# Altium footprint library DevKit - PCB.PcbLib: 30 footprints (part 1 of 2)
Each footprint in its own frame and in the unit in brackets; x right, y up, seen from the top. Pads: shape width x height; smd on the part's side, far side on the other; paste and mask are expansions set on the pad; w line width, h text height; cw(c..) or ccw(c..) is an arc to the next point about the centre after c.
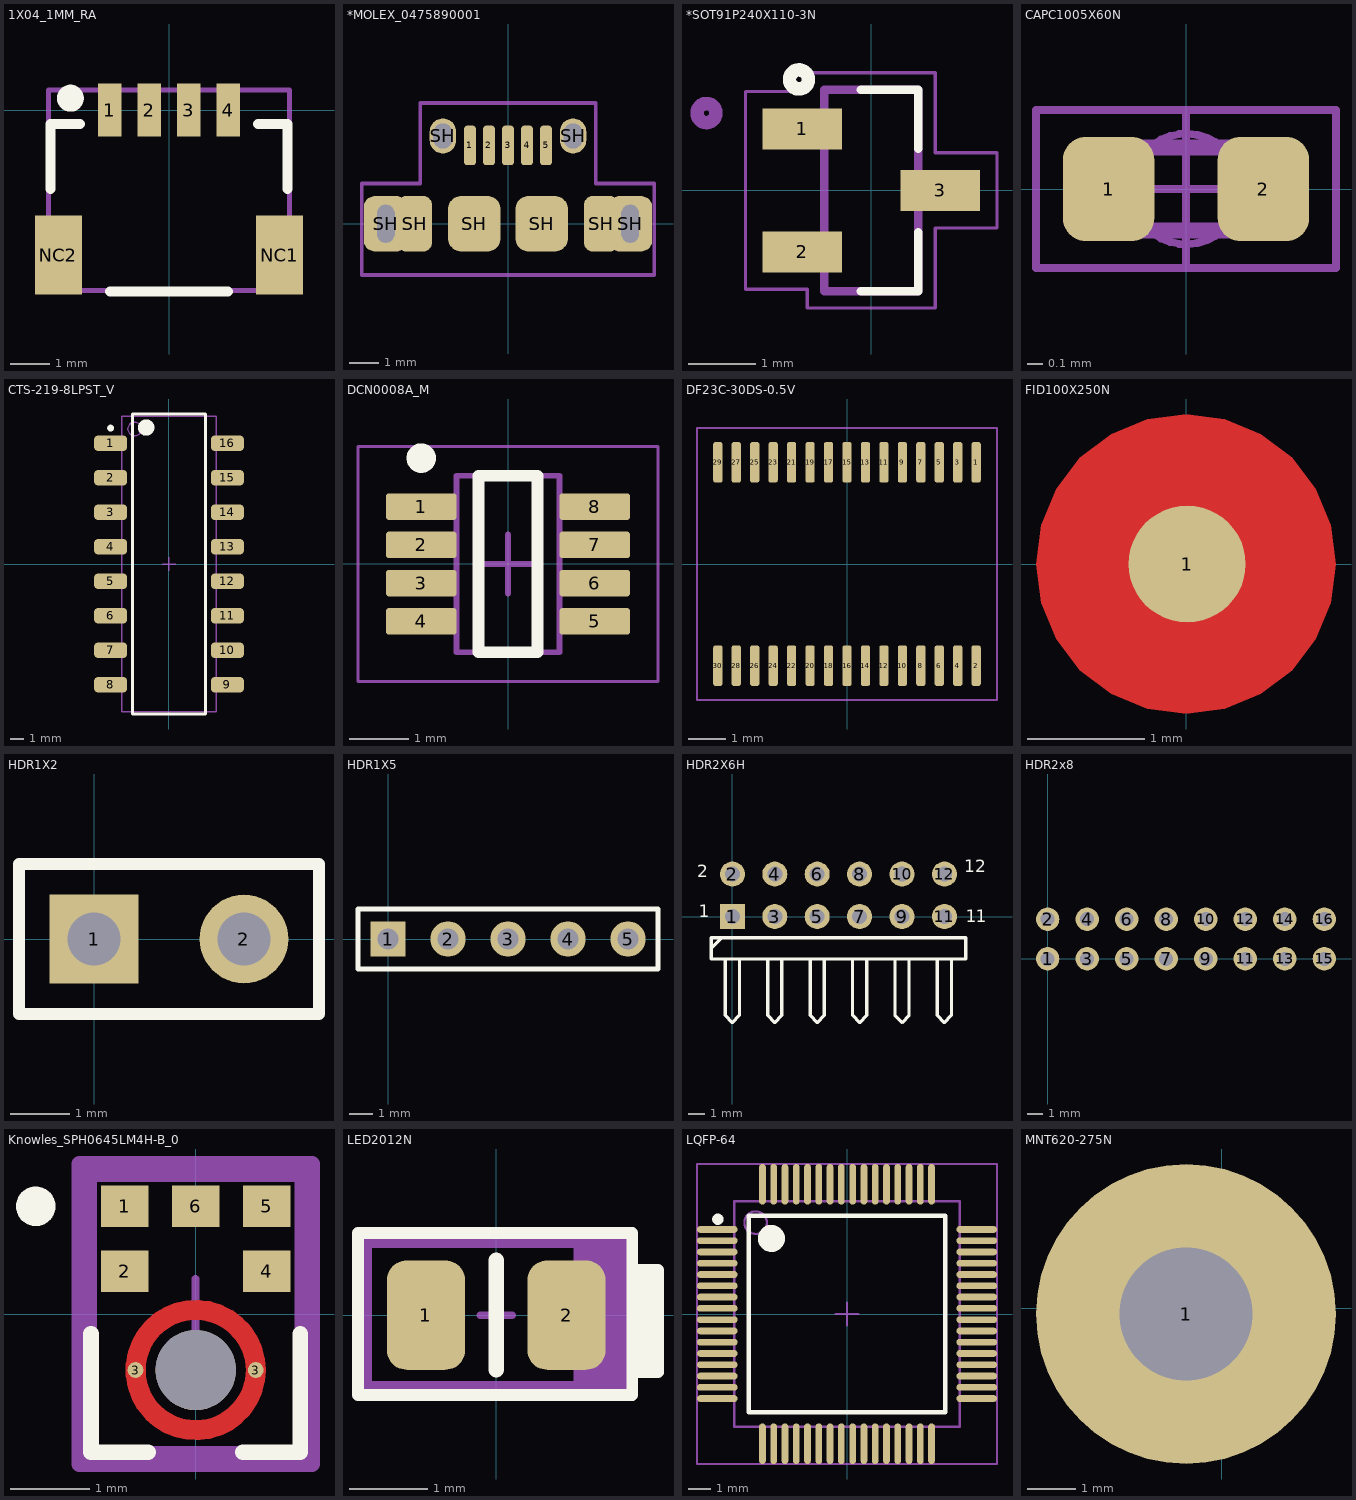
[diagram p0: the footprints below, top view; thin cyan lines are the x and y axes]

## 1X04_1MM_RA [mm]
pads (6):
  rect 0.6x1.35 smd: 1(-1.5,0) 2(-0.5,0) 3(0.5,0) 4(1.5,0)
  rect 1.2x2 smd: NC1(2.8,-3.675) NC2(-2.8,-3.675)
Top Overlay:
  circle w0.4: c-2.5,0.3 r0.141
  lines w0.254: -3,-2 -3,-0.35 -2.25,-0.35 ; -1.5,-4.6 1.5,-4.6 ; 2.25,-0.35 3,-0.35 3,-2
Mechanical 16:
  lines w0.127: -3.048,-4.572 -3.048,0.508 3.048,0.508 3.048,-4.572 -3.048,-4.572
  text ".Designator" at -1.016,-2.235 h1.5
3D body "SM04B-SRSS-TB(LF)(SN)--3DModel-STEP-56544.STEP": height 3.25, standoff 0.3, extent -3,-4.53 3,0.42

## *MOLEX_0475890001 [mm]
pads (13):
  rrect50% 0.4x1.35 smd mask+0.051: 1(-1.3,2.675) 2(-0.65,2.675) 3(0,2.675) 4(0.65,2.675) 5(1.3,2.675)
  rrect50% 1.5x1.9 hole 0.6 slot 1.3 at 90 deg: SH(-4.175,0) SH(4.175,0)
  rrect50% 1.175x1.9 smd: SH(-3.187,0) SH(3.187,0)
  oval 0.9x1.2 hole 0.65 slot 0.85 at 90 deg: SH(-2.225,3) SH(2.225,3)
  rrect50% 1.8x1.9 smd: SH(-1.15,0) SH(1.15,0)
Mechanical 16:
  lines w0.127: -5,-1.75 -5,1.375 -3,1.375 -3,4.125 3,4.125 3,1.375 5,1.375 5,-1.75 -5,-1.75
  text ".Designator" at -1.524,-0.33 h1.5
3D body "475890001.stp": height 2.74, standoff -0.57, extent -4.325,-2.719 4.325,3.175

## *SOT91P240X110-3N [mm]
pads (3):
  rect 1.18x0.61 smd: 1(-1.025,0.915) 2(-1.025,-0.915) 3(1.025,0)
Top Overlay:
  circle w0.2: c-1.075,1.65 r0.141
  lines w0.127: -0.152,-1.5 0.7,-1.5 0.7,-0.62 ; -0.152,1.5 0.7,1.5 0.7,0.62
Mechanical 4:
  circle w0.2: c-2.45,1.15 r0.141
  circle w0.2: c-2.45,1.15 r0.141
  lines w0.127: -0.7,-1.5 -0.7,1.5 ; -0.7,-1.5 -0.7,1.5 ; -0.7,-1.5 0.7,-1.5 ; -0.7,-1.5 0.7,-1.5 ; -0.7,1.5 0.7,1.5 ; -0.7,1.5 0.7,1.5 ; 0.7,-1.5 0.7,1.5 ; 0.7,-1.5 0.7,1.5
Mechanical 16:
  lines w0.05: -1.87,-1.47 -1.87,1.47 -0.95,1.47 -0.95,1.75 0.95,1.75 0.95,0.56 1.87,0.56 1.87,-0.56 0.95,-0.56 0.95,-1.75 -0.95,-1.75 -0.95,-1.47 -1.87,-1.47

## CAPC1005X60N [mm]
pads (2):
  rrect50% 0.58x0.66 smd: 1(-0.49,0) 2(0.49,0)
Mechanical 4:
  circle w0.05: c0,0 r0.35
  lines w0.05: -0.5,0 0.5,0 ; 0,-0.5 0,0.5 ; -0.95,-0.5 -0.95,0.5 0.95,0.5 0.95,-0.5 -0.95,-0.5
Mechanical 13:
  lines w0.001: -0.55,-0.3 -0.55,0.3 0.55,0.3 0.55,-0.3 -0.55,-0.3
Mechanical 16:
  lines w0.1: -0.512,-0.262 -0.512,0.262 0.512,0.262 0.512,-0.262 -0.512,-0.262
  text ".Designator" at 0.635,0.33 h1.5
3D body "CAP 0402 (1005 metric).STEP": height 0.55, standoff 0, extent -0.525,-0.275 0.525,0.275

## CTS-219-8LPST_V [mm]
pads (16):
  rrect50% 2.44x1.13 smd: 1(-4.3,8.89) 2(-4.3,6.35) 3(-4.3,3.81) 4(-4.3,1.27) 5(-4.3,-1.27) 6(-4.3,-3.81) 7(-4.3,-6.35) 8(-4.3,-8.89) 9(4.3,-8.89) 10(4.3,-6.35) 11(4.3,-3.81) 12(4.3,-1.27) 13(4.3,1.27) 14(4.3,3.81) 15(4.3,6.35) 16(4.3,8.89)
Top Overlay:
  circle w0.6: c-1.68,10.045 r0.3
  circle w0.25: c-4.3,10.005 r0.125
  lines w0.2: -2.68,-11.045 2.68,-11.045 2.68,11.045 -2.68,11.045 -2.68,-11.045
Mechanical 15:
  lines w0.1: -0.5,0 0.5,0 ; 0,-0.5 0,0.5
Mechanical 16:
  circle w0.1: c-2.525,9.945 r0.5
  lines w0.1: -3.475,-10.895 3.475,-10.895 3.475,10.895 -3.475,10.895 -3.475,-10.895
  text ".Designator" at 0.301,-0.11 h0.45
3D body "dipswitch254.stp": height 3.37, standoff -0.14, extent -5.103,-11.405 5.08,11.404

## DCN0008A_M [mm]
pads (8):
  rrect22% 1.2x0.45 smd mask+0.051: 1(-1.475,0.975) 2(-1.475,0.325) 3(-1.475,-0.325) 4(-1.475,-0.975) 5(1.475,-0.975) 6(1.475,-0.325) 7(1.475,0.325) 8(1.475,0.975)
Top Overlay:
  circle w0.25: c-1.475,1.8 r0.125
  lines w0.2: -0.5,-1.5 -0.5,1.5 0.5,1.5 0.5,-1.5 -0.5,-1.5
Mechanical 15:
  lines w0.05: -2.55,-2 2.55,-2 2.55,2 -2.55,2 -2.55,-2
  lines w0.1: -0.5,0 0.5,0 ; 0,-0.5 0,0.5
Mechanical 16:
  lines w0.1: -0.875,-1.5 0.875,-1.5 0.875,1.5 -0.875,1.5 -0.875,-1.5
  text ".Designator" at -0.762,-0.254 h0.45
3D body "INA219BIDCNR.STEP": height 1.45, standoff 0, extent -1.4,-1.45 1.4,1.45

## DF23C-30DS-0.5V [mm]
pads (30):
  rrect50% 0.25x1.1 smd mask+0.055: 1(3.5,2.755) 2(3.5,-2.755) 3(3,2.755) 4(3,-2.755) 5(2.5,2.755) 6(2.5,-2.755) 7(2,2.755) 8(2,-2.755) 9(1.5,2.755) 10(1.5,-2.755) 11(1,2.755) 12(1,-2.755) 13(0.5,2.755) 14(0.5,-2.755) 15(0,2.755) 16(0,-2.755) 17(-0.5,2.755) 18(-0.5,-2.755) 19(-1,2.755) 20(-1,-2.755) 21(-1.5,2.755) 22(-1.5,-2.755) 23(-2,2.755) 24(-2,-2.755) 25(-2.5,2.755) 26(-2.5,-2.755) 27(-3,2.755) 28(-3,-2.755) 29(-3.5,2.755) 30(-3.5,-2.755)
Mechanical 16:
  lines w0.05: -4.064,-3.683 -4.064,3.683 4.064,3.683 4.064,-3.683 -4.064,-3.683
  text ".Designator" at -1.2,0.2 h0.8
3D body "DF23C-30DS-0.5V.stp": height 1.51, standoff 0.06, extent -5.05,-3 5.05,3

## FID100X250N [mm]
pads (1):
  round 1 smd paste-0.5 mask+0.75: 1(0.01,0)
Top Layer:
  pour cut-out: 1.281,0 1.237,0.332 1.109,0.64 0.906,0.906 0.64,1.109 0.332,1.237 0,1.281 -0.332,1.237 -0.64,1.109 -0.906,0.906 -1.109,0.64 -1.237,0.332 -1.281,0 -1.237,-0.332 -1.109,-0.64 -0.906,-0.906 -0.64,-1.109 -0.332,-1.237 0,-1.281 0.332,-1.237 0.64,-1.109 0.906,-0.906 1.109,-0.64 1.237,-0.332

## HDR1X2 [mm]
pads (2):
  rect 1.5x1.5 hole 0.9: 1(0,0)
  round 1.5 hole 0.9: 2(2.54,0)
Top Overlay:
  lines w0.2: -1.27,-1.27 -1.27,1.27 3.81,1.27 3.81,-1.27 -1.27,-1.27

## HDR1X5 [mm]
pads (5):
  rect 1.5x1.5 hole 0.9: 1(0,0)
  round 1.5 hole 0.9: 2(2.54,0) 3(5.08,0) 4(7.62,0) 5(10.16,0)
Top Overlay:
  lines w0.2: -1.27,-1.27 -1.27,1.27 11.43,1.27 11.43,-1.27 -1.27,-1.27

## HDR2X6H [mm]
pads (12):
  rect 1.5x1.5 hole 0.9: 1(0,0)
  round 1.5 hole 0.9: 2(0,2.54) 3(2.54,0) 4(2.54,2.54) 5(5.08,0) 6(5.08,2.54) 7(7.62,0) 8(7.62,2.54) 9(10.16,0) 10(10.16,2.54) 11(12.7,0) 12(12.7,2.54)
Top Overlay:
  lines w0.2: -1.27,-1.905 -0.635,-1.27 ; -0.423,-2.54 -0.423,-5.927 0,-6.35 0.423,-5.927 0.423,-2.54 ; 2.117,-2.54 2.117,-5.927 2.54,-6.35 2.963,-5.927 2.963,-2.54 ; 4.657,-2.54 4.657,-5.927 5.08,-6.35 5.503,-5.927 5.503,-2.54 ; 7.197,-2.54 7.197,-5.927 7.62,-6.35 8.043,-5.927 8.043,-2.54 ; 9.737,-2.54 9.737,-5.927 10.16,-6.35 10.583,-5.927 10.583,-2.54 ; 12.277,-2.54 12.277,-5.927 12.7,-6.35 13.123,-5.927 13.123,-2.54 ; -1.27,-2.54 13.97,-2.54 13.97,-1.27 -1.27,-1.27 -1.27,-2.54
  text "12" at 13.88,2.39 h1.27
  text "1" at 13.98,-0.61 h1.27
  text "1" at 14.58,-0.61 h1.27
  text "2" at -2.12,2.09 h1.27
  text "1" at -2.02,-0.31 h1.27

## HDR2x8 [mm]
pads (16):
  round 1.5 hole 0.9: 1(0,0) 2(0,2.54) 3(2.54,0) 4(2.54,2.54) 5(5.08,0) 6(5.08,2.54) 7(7.62,0) 8(7.62,2.54) 9(10.16,0) 10(10.16,2.54) 11(12.7,0) 12(12.7,2.54) 13(15.24,0) 14(15.24,2.54) 15(17.78,0) 16(17.78,2.54)

## Knowles_SPH0645LM4H-B_0 [mm]
pads (8):
  rect 0.6x0.522 smd paste+0 mask+0: 1(-0.9,1.364) 2(-0.9,0.542) 4(0.9,0.542) 5(0.9,1.364) 6(0,1.364)
  round 0.2 smd: 3(-0.762,-0.71) 3(0.762,-0.71)
  round 1.016 hole 1.016 unplated mask+0: ""(0,-0.71)
Top Layer:
  circle w0.254: c0,-0.71 r0.762
Top Overlay:
  circle w0.25: c-2.026,1.364 r0.125
  lines w0.2: -1.325,-0.25 -1.325,-1.75 -0.6,-1.75 ; 0.6,-1.75 1.325,-1.75 1.325,-0.25
Top Paste:
  circle w0.254: c0,-0.71 r0.762
Top Solder:
  circle w0.508: c0,-0.71 r0.762
Bottom Solder:
  circle w0.254: c0,-0.71 r0.635
Mechanical 12:
  lines w0.15: -1.325,-1.75 -1.325,1.75 1.325,1.75 1.325,-1.75 -1.325,-1.75
Mechanical 15:
  lines w0.1: -0.443,0 0.443,0 ; 0,-0.443 0,0.443
  lines w0.2: -1.475,-1.9 -1.475,1.9 1.475,1.9 1.475,-1.9 -1.475,-1.9
Mechanical 16:
  lines w0.2: -1.475,-1.9 -1.475,1.9 1.475,1.9 1.475,-1.9 -1.475,-1.9
  text ".Designator" at 0,0 h1
3D body "sph0645lm4h-b.stp": height 1.23, standoff 0.25, extent -1.325,-1.75 1.325,1.75

## LED2012N [mm]
pads (2):
  rrect50% 1x1.4 smd: 1(-0.9,0) 2(0.9,0)
Top Overlay:
  lines w0.151: 1.74,-0.73 2.07,-0.73 2.07,0.58 1.74,0.58 ; 1.84,-0.68 1.84,0.58 1.85,0.58 ; 1.96,0.58 1.97,0.58 1.97,-0.73 ; -1.77,-1.02 -1.77,1.05 -1.72,1.05 1.74,1.05 1.74,-1.02 -1.77,-1.02
  lines w0.2: 0,-0.7 0,0.7
Mechanical 15:
  lines w0.1: -0.2,0 0.2,0 ; 0,-0.2 0,0.2 ; -1.71,-0.93 -1.71,0.96 1.64,0.96 1.64,-0.93 -1.71,-0.93
Mechanical 16:
  lines w0.2: 1.09,-0.91 1.09,0.96 1.11,0.96 ; 1.24,0.96 1.25,0.96 1.25,-0.94 ; 1.42,-0.94 1.42,0.96 ; -1.69,-0.94 1.59,-0.94 1.59,0.96 -1.69,0.96 -1.69,-0.94
  text ".Designator" at 2.265,1.45 h1.5
3D body: height 0.1, standoff 0, extent -0.3,-0.4 0.3,0.4
3D body: height 0.3, standoff 0.1, extent -1,-0.625 1,0.625
3D body: height 0.8, standoff 0.3, extent -0.673,-0.625 0.728,0.625
3D body: height 0.3, standoff 0.1, extent -1,-0.625 1,0.625
3D body: height 0.1, standoff 0, extent -1,-0.625 1,0.625

## LQFP-64 [mm]
pads (64):
  oval 1.8x0.3 smd mask+0.051: 1(-5.75,3.75) 2(-5.75,3.25) 3(-5.75,2.75) 4(-5.75,2.25) 5(-5.75,1.75) 6(-5.75,1.25) 7(-5.75,0.75) 8(-5.75,0.25) 9(-5.75,-0.25) 10(-5.75,-0.75) 11(-5.75,-1.25) 12(-5.75,-1.75) 13(-5.75,-2.25) 14(-5.75,-2.75) 15(-5.75,-3.25) 16(-5.75,-3.75) 33(5.75,-3.75) 34(5.75,-3.25) 35(5.75,-2.75) 36(5.75,-2.25) 37(5.75,-1.75) 38(5.75,-1.25) 39(5.75,-0.75) 40(5.75,-0.25) 41(5.75,0.25) 42(5.75,0.75) 43(5.75,1.25) 44(5.75,1.75) 45(5.75,2.25) 46(5.75,2.75) 47(5.75,3.25) 48(5.75,3.75)
  oval 0.3x1.8 smd mask+0.051: 17(-3.75,-5.75) 18(-3.25,-5.75) 19(-2.75,-5.75) 20(-2.25,-5.75) 21(-1.75,-5.75) 22(-1.25,-5.75) 23(-0.75,-5.75) 24(-0.25,-5.75) 25(0.25,-5.75) 26(0.75,-5.75) 27(1.25,-5.75) 28(1.75,-5.75) 29(2.25,-5.75) 30(2.75,-5.75) 31(3.25,-5.75) 32(3.75,-5.75) 49(3.75,5.75) 50(3.25,5.75) 51(2.75,5.75) 52(2.25,5.75) 53(1.75,5.75) 54(1.25,5.75) 55(0.75,5.75) 56(0.25,5.75) 57(-0.25,5.75) 58(-0.75,5.75) 59(-1.25,5.75) 60(-1.75,5.75) 61(-2.25,5.75) 62(-2.75,5.75) 63(-3.25,5.75) 64(-3.75,5.75)
Top Overlay:
  circle w0.6: c-3.35,3.35 r0.3
  circle w0.25: c-5.725,4.2 r0.125
  lines w0.2: -4.35,-4.35 4.35,-4.35 4.35,4.35 -4.35,4.35 -4.35,-4.35
Mechanical 15:
  lines w0.1: -0.5,0 0.5,0 ; 0,-0.5 0,0.5 ; -6.65,-6.65 6.65,-6.65 6.65,6.65 -6.65,6.65 -6.65,-6.65
Mechanical 16:
  circle w0.1: c-4.05,4.05 r0.5
  lines w0.1: -5,-5 -5,5 5,5 5,-5 -5,-5
  text ".Designator" at -1.831,-0.402 h1.5
3D body: height 1.6, standoff 0.15, extent -5,-5 5,5

## MNT620-275N [mm]
pads (1):
  round 6.2 / inner round 4.5 / far side round 6.2 hole 2.75 paste-3.15: 1(-0.74,-0.12)